# Altium footprint library MEGAphone.PcbLib: 64 footprints (part 4 of 4)
Each footprint in its own frame and in the unit in brackets; x right, y up, seen from the top. Pads: shape width x height; smd on the part's side, far side on the other; paste and mask are expansions set on the pad; w line width, h text height; cw(c..) or ccw(c..) is an arc to the next point about the centre after c.
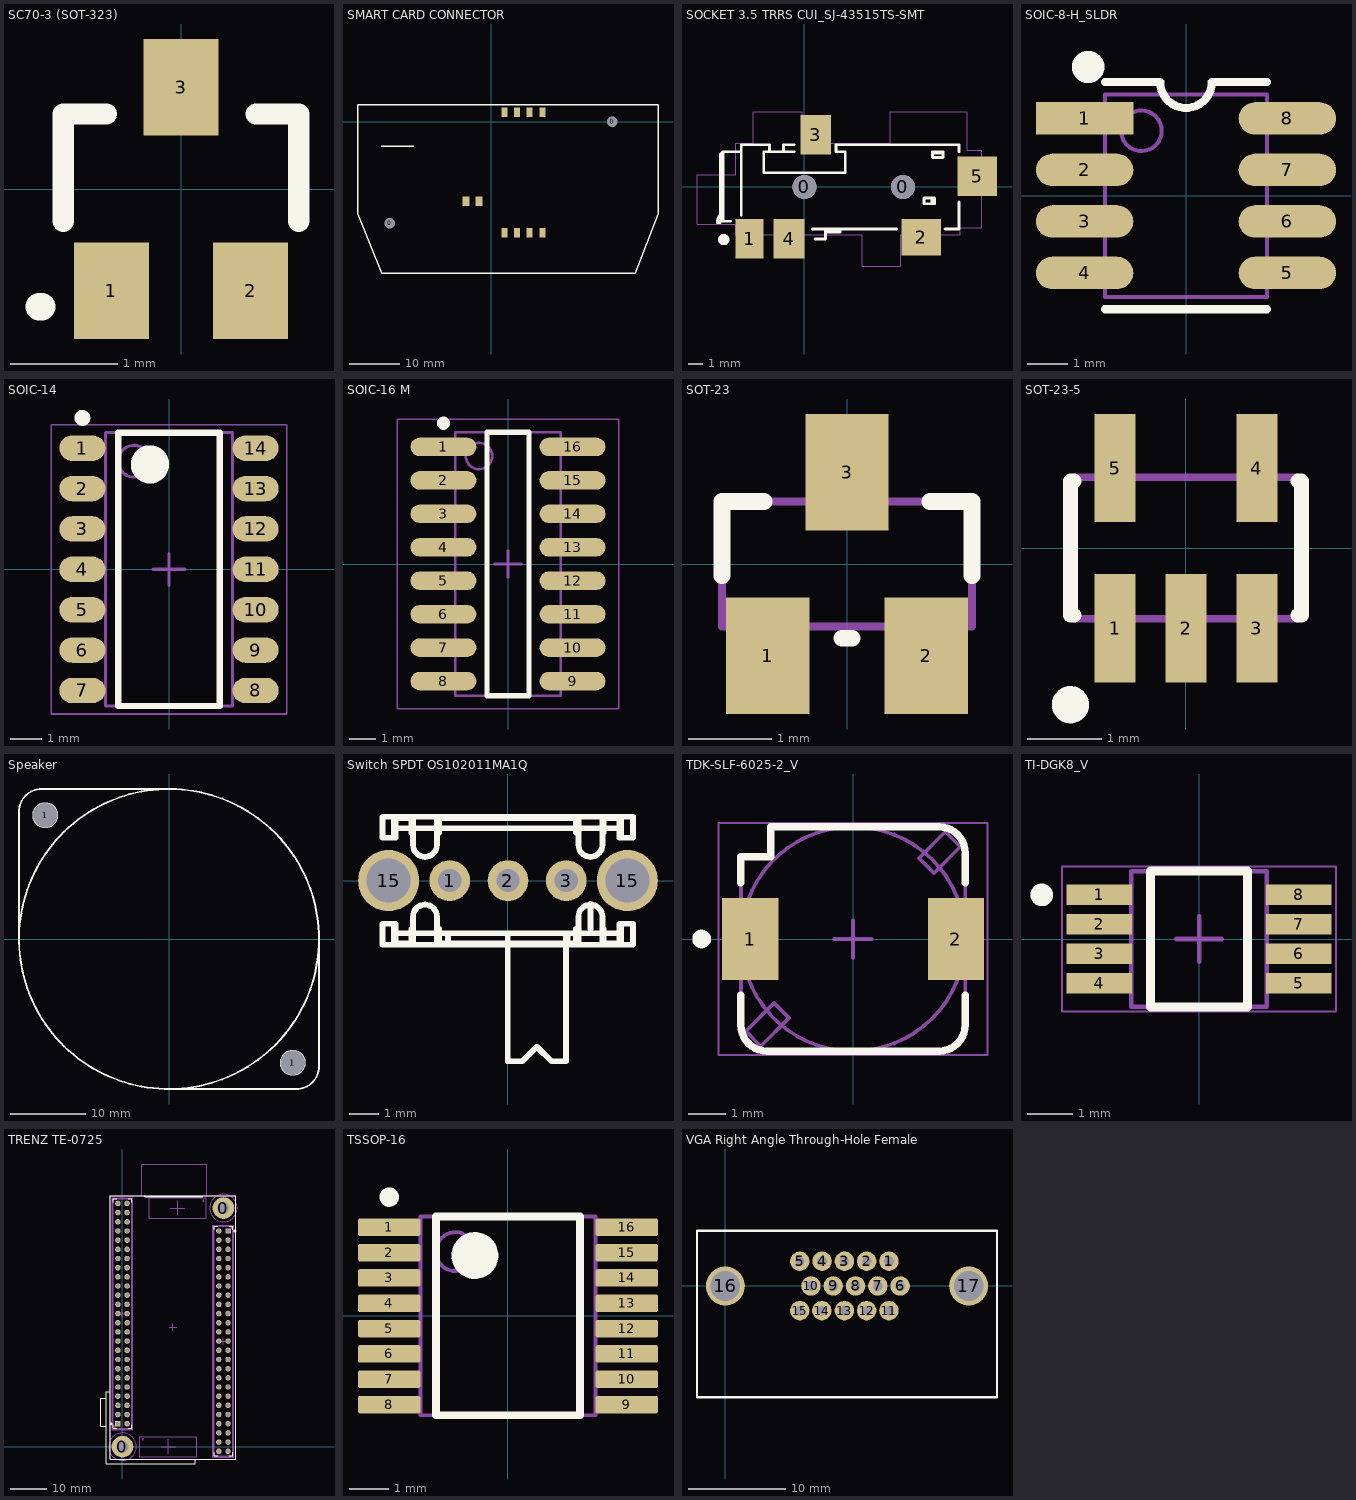
[diagram p3: the footprints below, top view; thin cyan lines are the x and y axes]

## SC70-3 (SOT-323) [mm]
height 0.9
pads (3):
  rect 0.7x0.9 smd paste-0.025 mask+0.05: 1(-0.65,-0.95) 2(0.65,-0.95) 3(0,0.95)
Top Overlay:
  lines w0.2: -1.1,-0.3 -1.1,0.7 -0.7,0.7 ; 0.7,0.7 1.1,0.7 1.1,-0.3
  lines w0.254: -1.325,-1.1 -1.3,-1.1
3D body: height 0.9, standoff 0, extent -1.075,-0.725 1.075,0.7

## SMART CARD CONNECTOR [mm] "609-4481-ND"
pads (12):
  round 1.524 hole 2.1: 0(-20.28,-20.32) 0(24.17,0)
  rect 1.2x1.9 smd: 1(10.2,-22.21) 2(7.66,-22.21) 3(5.12,-22.21) 4(2.58,-22.21) 5(10.2,1.89) 6(7.66,1.89) 7(5.12,1.89) 8(2.58,1.89)
  rect 1.4x1.9 smd: 9(-2.5,-15.91) 10(-5.04,-15.91)
Top Overlay:
  lines w0.254: -21.971,-4.953 -15.494,-4.953 ; -26.63,-18.411 -21.844,-30.3 28.702,-30.3 33.274,-18.411 33.274,3.4 -26.63,3.4 -26.63,-18.411
3D body "7312P0225A13LFC.stp": height 3.5, standoff -0.85, extent -25.51,-29.76 32.29,3.94

## SOCKET 3.5 TRRS CUI_SJ-43515TS-SMT [mm] "3.5 MM AUDIO JACKS"
height 5
pads (7):
  round 1.7 hole 1.7 unplated: 0(0,0) 0(7,0)
  rect 2x2.8 smd: 1(-3.9,-3.7)
  rect 2.8x2.6 smd: 2(8.3,-3.6)
  rect 2.2x2.8 smd: 3(0.8,3.7) 4(-1.1,-3.7)
  rect 2.8x2.8 smd: 5(12.3,0.75)
Top Overlay:
  circle w0.4: c-5.75,-3.75 r0.2
  lines w0.2: -6,-1.967 ccw(c-5.25,-2.55) -6.2,-2.55 -6,-2.55 cw(c-5.25,-2.55) -5.955,-2.294 ; -5.25,-2.449 -5.8,-2.449 ; -4.5,-2 -4.5,3 -2.5,3 -2.5,2.5 ; -4.5,2.5 -5.8,2.5 ; -2.9,2.4 -2.9,1 2.9,1 2.9,2.4 ; -2.9,2.5 -0.75,2.5 ; -1.5,2.5 -1.5,3 -0.75,3 ; 0.575,-3 1.5,-3 ; 0.75,-3.7 1.5,-3.7 1.5,-3 ; 1.5,-3.2 2.55,-3.2 2.55,-3 ; 2.338,-3.2 2.338,-3 ; 2.9,2.5 2.25,2.5 2.25,3 11,3 11,2.5 ; 6.55,-3 1.5,-3 ; 9.05,-0.8 9.05,-1.15 9.25,-1.15 ; 9.1,2.4 9.85,2.4 ; 10,-3 11,-3 11,-1.075 ; -5.8,-2.449 -5.8,2.5 ; -5.8,-2.449 -5.807,-2.442 -5.814,-2.435 -5.821,-2.428 -5.828,-2.42 -5.835,-2.413 -5.843,-2.406 -5.85,-2.398 -5.857,-2.39 -5.865,-2.383 -5.873,-2.375 -5.88,-2.367 -5.888,-2.359 -5.896,-2.351 -5.904,-2.343 -5.912,-2.335 -5.92,-2.327 -5.928,-2.318 -5.936,-2.31 -5.944,-2.302 -5.953,-2.293 -5.961,-2.285 -5.97,-2.276 -5.978,-2.267 -5.987,-2.258 -5.996,-2.249 -6,-2.245 -6,2.3 -5.8,2.5 ; 8.5,-1.2 9.25,-1.2 9.25,-0.8 8.5,-0.8 8.5,-1.2 ; 9.1,2.1 9.1,2.5 9.85,2.5 9.85,2.1 9.1,2.1
Mechanical 4:
  lines w0.05: -7.65,-2.65 -7.65,0.85 -4.9,0.85 -4.9,3.1 -3.65,3.1 -3.65,5.35 -0.15,5.35 -0.15,3.1 6.1,3.1 6.1,5.35 11.6,5.35 11.6,2.6 12.6,2.6 12.6,-2.9 11.1,-2.9 11.1,-3.4 6.85,-3.4 6.85,-5.65 4.1,-5.65 4.1,-3.4 -4.9,-3.4 -4.9,-2.65 -7.65,-2.65
3D body "CUI_SJ-43515TS-SMT-TR.step": height 5.1, standoff -0.7, extent -6.2,-4.5 13,4.5

## SOIC-8-H_SLDR [mm]
pads (8):
  rect 2.4x0.8 smd: 1(-2.5,1.905)
  oval 2.4x0.8 smd: 2(-2.5,0.635) 3(-2.5,-0.635) 4(-2.5,-1.905) 5(2.5,-1.905) 6(2.5,-0.635) 7(2.5,0.635) 8(2.5,1.905)
Top Overlay:
  circle w0.4: c-2.413,3.175 r0.2
  lines w0.2: -2,-2.8 2,-2.8 ; -2,2.8 -0.635,2.8 ccw(c0,2.8) 0.635,2.8 2,2.8
Mechanical 13:
  circle w0.1: c-1.1,1.6 r0.5
  lines w0.1: -2,-2.5 -2,2.5 2,2.5 2,-2.5 -2,-2.5
3D body: height 1.75, standoff 0.1, extent -2,-2.5 2,2.5

## SOIC-14 [mm] "SOIC, 14-Leads, Body 8.65x3.90mm, Pitch 1.27mm, IPC Medium Density"
height 1.75
pads (14):
  oval 1.45x0.8 smd: 1(-2.725,3.81) 2(-2.725,2.54) 3(-2.725,1.27) 4(-2.725,0) 5(-2.725,-1.27) 6(-2.725,-2.54) 7(-2.725,-3.81) 8(2.725,-3.81) 9(2.725,-2.54) 10(2.725,-1.27) 11(2.725,0) 12(2.725,1.27) 13(2.725,2.54) 14(2.725,3.81)
Top Overlay:
  circle w0.25: c-2.725,4.76 r0.125
  circle w0.6: c-0.6,3.3 r0.3
  lines w0.2: -1.6,-4.3 -1.6,4.3 1.6,4.3 1.6,-4.3 -1.6,-4.3
Mechanical 13:
  circle w0.1: c-1.1,3.4 r0.5
  lines w0.1: -2,-4.3 -2,4.3 2,4.3 2,-4.3 -2,-4.3
Mechanical 15:
  lines w0.05: -3.7,-4.55 -3.7,4.55 3.7,4.55 3.7,-4.55 -3.7,-4.55
  lines w0.1: -0.5,0 0.5,0 ; 0,-0.5 0,0.5
3D body "SOIC127P600X175-14N.step": height 1.75, standoff 0, extent -3,-4.3 3,4.3

## SOIC-16 M [mm] "SOIC 16 pin low density"
pads (16):
  oval 2.5x0.7 smd: 1(-2.45,4.445) 2(-2.45,3.175) 3(-2.45,1.905) 4(-2.45,0.635) 5(-2.45,-0.635) 6(-2.45,-1.905) 7(-2.45,-3.175) 8(-2.45,-4.445) 9(2.45,-4.445) 10(2.45,-3.175) 11(2.45,-1.905) 12(2.45,-0.635) 13(2.45,0.635) 14(2.45,1.905) 15(2.45,3.175) 16(2.45,4.445)
Top Overlay:
  circle w0.25: c-2.45,5.345 r0.125
  lines w0.2: -0.8,-5 0.8,-5 0.8,5 -0.8,5 -0.8,-5
Mechanical 13:
  circle w0.1: c-1.1,4.1 r0.5
  lines w0.1: -2,-5 2,-5 2,5 -2,5 -2,-5
Mechanical 15:
  lines w0.05: -4.2,-5.5 4.2,-5.5 4.2,5.5 -4.2,5.5 -4.2,-5.5
  lines w0.1: -0.5,0 0.5,0 ; 0,-0.5 0,0.5
3D body: height 1.75, standoff 0.1, extent -2,-5 2,5

## SOT-23 [mm]
height 8.9
pads (3):
  rect 1x1.4 smd: 1(-0.95,-1.1) 2(0.95,-1.1) 3(0,1.1)
Top Overlay:
  lines w0.2: -1.499,-0.14 -1.499,0.749 -0.991,0.749 ; -0.063,-0.889 0.064,-0.889 ; 0.991,0.749 1.499,0.749 1.499,-0.14
Mechanical 13:
  lines w0.1: -1.5,-0.75 -1.5,0.75 1.5,0.75 1.5,-0.75 -1.5,-0.75
3D body: height 1.3, standoff 0.1, extent -1.499,-0.749 1.499,0.749

## SOT-23-5 [mm]
pads (5):
  rect 0.55x1.45 smd: 1(-0.948,-1.075) 2(0.002,-1.075) 3(0.952,-1.075) 4(0.952,1.075) 5(-0.948,1.075)
Top Overlay:
  circle w0.25: c-1.548,-2.1 r0.125
  lines w0.2: -1.498,-0.9 -1.548,-0.9 -1.548,0.9 -1.498,0.9 ; 1.502,-0.9 1.552,-0.9 1.552,0.9 1.502,0.9
Mechanical 13:
  lines w0.1: -1.5,-0.95 1.5,-0.95 1.5,0.95 -1.5,0.95 -1.5,-0.95
3D body: height 1.45, standoff 0.08, extent -1.499,-0.949 1.499,0.949

## Speaker [mm]
pads (2):
  round 1.524 hole 3.2: 1(-16.5,16.5) 1(16.5,-16.5)
Top Overlay:
  circle w0.254: c0,0 r20
  circle w0.254: c16.5,-16.5 r1.6
  circle w0.254: c-16.5,16.5 r1.6
  lines w0.254: -20,0 -20,17 cw(c-17,17) -17,20 0,20 ; 0,-20 17,-20 ccw(c17,-17) 20,-17 20,0

## Switch SPDT OS102011MA1Q [mm] "C&K OS Series  Miniature Slide Switches RA, SPDT"
height 3.9
pads (5):
  round 1.4 hole 0.8 mask+0: 1(-2,0) 2(0,0) 3(2,0)
  round 2.1 hole 1.5 mask+0: 15(-4.1,0) 15(4.1,0)
Top Overlay:
  lines w0.2: -3.91,-1.482 -3.91,-2.206 -4.31,-2.206 -4.31,-1.482 -3.853,-1.482 -3.853,-2.206 3.833,-2.206 3.833,-1.482 4.29,-1.482 4.29,-2.206 3.89,-2.206 3.89,-1.482 ; -3.91,1.47 -3.91,2.194 -4.31,2.194 -4.31,1.47 -3.853,1.47 -3.853,2.194 3.833,2.194 3.833,1.47 4.29,1.47 4.29,2.194 3.89,2.194 3.89,1.47 ; -3.853,-1.806 3.833,-1.806 ; -3.853,1.794 3.833,1.794 ; -3.85,-2.156 -3.31,-2.156 -3.31,-1.656 ; -3.85,2.144 -3.31,2.144 -3.31,1.644 ; -3.26,-2.206 -3.26,-1.236 cw(c-2.85,-1.236) -2.44,-1.236 -2.44,-2.206 ; -3.26,2.194 -3.26,1.224 ccw(c-2.85,1.224) -2.44,1.224 -2.44,2.194 ; -2.36,-1.656 -2.36,-2.156 2.34,-2.156 2.34,-1.656 ; -2.36,1.644 -2.36,2.144 2.34,2.144 2.34,1.644 ; -2.06,-2.206 -2.06,-1.806 ; -0.01,-1.806 -0.01,-2.206 -0.01,-6.206 0.49,-6.206 0.99,-5.706 1.49,-6.206 1.99,-6.206 1.99,-2.206 1.99,-1.806 ; 2.04,-2.206 2.04,-1.806 ; 2.42,-2.206 2.42,-1.236 cw(c2.83,-1.236) 3.24,-1.236 3.24,-2.206 ; 2.42,2.194 2.42,1.224 ccw(c2.83,1.224) 3.24,1.224 3.24,2.194 ; 2.83,-1.667 2.83,-0.806 ; 3.29,-1.656 3.29,-2.156 3.83,-2.156 ; 3.29,1.644 3.29,2.144 3.83,2.144
3D body "OS102011MA1QN1.stp": height 4.7, standoff -2.9, extent -4.3,-6.2 4.3,2.2

## TDK-SLF-6025-2_V [mm] "SMD, 2-Leads, Body 6x6mm, Height 2.7mm"
height 2.7
pads (2):
  rect 1.5x2.2 smd: 1(-2.75,0) 2(2.75,0)
Top Overlay:
  circle w0.25: c-4.05,0 r0.125
  lines w0.2: -3,-1.5 -3,-2.3 ccw(c-2.3,-2.3) -2.3,-3 2.3,-3 ccw(c2.3,-2.3) 3,-2.3 3,-1.5 ; -3,1.5 -3,2.2 -2.2,2.2 -2.2,3 2.3,3 cw(c2.3,2.3) 3,2.3 3,1.5
Mechanical 13:
  circle w0.1: c0,0 r3
  lines w0.1: -3,-2.3 ccw(c-2.3,-2.3) -2.3,-3 2.3,-3 ccw(c2.3,-2.3) 3,-2.3 3,-1 2.1,-1 2.1,1 3,1 3,2.3 ccw(c2.3,2.3) 2.3,3 -2.2,3 -2.2,2.2 -3,2.2 -3,1 -2.1,1 -2.1,-1 -3,-1 -3,-2.3 ; -2.867,-2.467 -2.467,-2.867 -1.712,-2.112 -2.112,-1.712 -2.867,-2.467 ; 1.762,2.161 2.467,2.867 2.867,2.467 2.161,1.762 1.762,2.161
Mechanical 15:
  lines w0.05: -3.6,-3.1 3.6,-3.1 3.6,3.1 -3.6,3.1 -3.6,-3.1
  lines w0.1: -0.5,0 0.5,0 ; 0,-0.5 0,0.5
3D body: height 1.3, standoff 0.8, extent 1.762,1.762 2.867,2.867
3D body: height 1.3, standoff 0.8, extent -2.829,-2.829 -1.712,-1.712
3D body: height 0.8, standoff 0, extent -3.001,-3.001 3.001,3.001
3D body: height 2.7, standoff 0.8, extent -2.999,-2.999 2.999,2.999

## TEST [mm]

## TI-DGK8_V [mm] "VSSOP, 8-Leads, Body 3x3mm, Pitch 0.65mm"
height 1.1
pads (8):
  rect 1.45x0.45 smd paste+0 mask+0.05: 1(-2.2,0.975) 2(-2.2,0.325) 3(-2.2,-0.325) 4(-2.2,-0.975) 5(2.2,-0.975) 6(2.2,-0.325) 7(2.2,0.325) 8(2.2,0.975)
Top Overlay:
  circle w0.25: c-3.475,0.975 r0.125
  lines w0.2: -1.075,-1.5 1.075,-1.5 1.075,1.5 -1.075,1.5 -1.075,-1.5
Mechanical 13:
  lines w0.1: -1.5,-1.5 1.5,-1.5 1.5,1.5 -1.5,1.5 -1.5,-1.5
Mechanical 15:
  lines w0.05: -3.025,-1.6 3.025,-1.6 3.025,1.6 -3.025,1.6 -3.025,-1.6
  lines w0.1: -0.5,0 0.5,0 ; 0,-0.5 0,0.5
3D body: height 1.1, standoff 0.05, extent -1.5,-1.5 1.5,1.5

## TRENZ TE-0725 [mm] "FPGA Break out using 2 off 50pos headers"
pads (102):
  round 6 hole 3.2: 0(0,0) 0(27.94,66.042)
  rect 1.5x1.5 hole 1: 1A(-1.27,6.351) 1B(29.21,59.692)
  round 1.5 hole 1: 2A(1.27,6.351) 2B(26.67,59.692) 3A(-1.27,8.891) 3B(29.21,57.152) 4A(1.27,8.891) 4B(26.67,57.152) 5A(-1.27,11.431) 5B(29.21,54.612) 6A(1.27,11.431) 6B(26.67,54.612) 7A(-1.27,13.971) 7B(29.21,52.072) 8A(1.27,13.971) 8B(26.67,52.072) 9A(-1.27,16.511) 9B(29.21,49.532) 10A(1.27,16.511) 10B(26.67,49.532) 11A(-1.27,19.051) 11B(29.21,46.992) 12A(1.27,19.051) 12B(26.67,46.992) 13A(-1.27,21.591) 13B(29.21,44.452) 14A(1.27,21.591) 14B(26.67,44.452) 15A(-1.27,24.131) 15B(29.21,41.912) 16A(1.27,24.131) 16B(26.67,41.912) 17A(-1.27,26.671) 17B(29.21,39.372) 18A(1.27,26.671) 18B(26.67,39.372) 19A(-1.27,29.211) 19B(29.21,36.832) 20A(1.27,29.211) 20B(26.67,36.832) 21A(-1.27,31.751) 21B(29.21,34.292) 22A(1.27,31.751) 22B(26.67,34.292) 23A(-1.27,34.291) 23B(29.21,31.752) 24A(1.27,34.291) 24B(26.67,31.752) 25A(-1.27,36.831) 25B(29.21,29.212) 26A(1.27,36.831) 26B(26.67,29.212) 27A(-1.27,39.371) 27B(29.21,26.672) 28A(1.27,39.371) 28B(26.67,26.672) 29A(-1.27,41.911) 29B(29.21,24.132) 30A(1.27,41.911) 30B(26.67,24.132) 31A(-1.27,44.451) 31B(29.21,21.592) 32A(1.27,44.451) 32B(26.67,21.592) 33A(-1.27,46.991) 33B(29.21,19.052) 34A(1.27,46.991) 34B(26.67,19.052) 35A(-1.27,49.531) 35B(29.21,16.512) 36A(1.27,49.531) 36B(26.67,16.512) 37A(-1.27,52.071) 37B(29.21,13.972) 38A(1.27,52.071) 38B(26.67,13.972) 39A(-1.27,54.611) 39B(29.21,11.432) 40A(1.27,54.611) 40B(26.67,11.432) 41A(-1.27,57.151) 41B(29.21,8.892) 42A(1.27,57.151) 42B(26.67,8.892) 43A(-1.27,59.691) 43B(29.21,6.352) 44A(1.27,59.691) 44B(26.67,6.352) 45A(-1.27,62.231) 45B(29.21,3.812) 46A(1.27,62.231) 46B(26.67,3.812) 47A(-1.27,64.771) 47B(29.21,1.272) 48A(1.27,64.771) 48B(26.67,1.272) 49A(-1.27,67.311) 49B(29.21,-1.268) 50A(1.27,67.311) 50B(26.67,-1.268)
Top Overlay:
  circle w0.4: c-3.17,6.351 r0.2
  circle w0.4: c31.11,59.692 r0.2
  lines w0.2: -4.476,5.711 -5.998,5.711 -5.998,13.393 -4.476,13.393 ; -3.431,15.227 -4.476,15.227 -4.476,-4.793 20.078,-4.793 20.078,-3.457 ; -2.54,6.061 -2.54,5.081 -1.56,5.081 ; -2.54,67.601 -2.54,68.581 -1.56,68.581 ; 1.56,5.081 2.54,5.081 2.54,6.061 ; 1.56,68.581 2.54,68.581 2.54,67.601 ; 6.2,69.2 6.2,69.463 ; 6.26,69.21 22.143,69.21 22.143,69.473 ; 25.4,-1.558 25.4,-2.538 26.38,-2.538 ; 25.4,59.982 25.4,60.962 26.38,60.962 ; 29.5,-2.538 30.48,-2.538 30.48,-1.558 ; 29.5,60.962 30.48,60.962 30.48,59.982 ; -3.431,-3.457 -3.431,69.473 31.369,69.473 31.369,-3.457 -3.431,-3.457
Mechanical 11:
  circle w0.3: c22.32,68.089 r0.15
  circle w0.3: c5.62,2.046 r0.15
  circle w0.3: c-2.17,5.496 r0.15
  circle w0.3: c30.11,60.547 r0.15
  lines w0.05: -1,36.831 1,36.831 ; 0,-1 0,1 ; 0,35.831 0,37.831 ; 5.145,69.486 5.145,78.224 23.245,78.224 23.245,69.486 ; 10.7,0 14.7,0 ; 12.7,-2 12.7,2 ; 12.97,33.021 14.97,33.021 ; 13.24,66.042 17.24,66.042 ; 13.97,32.021 13.97,34.021 ; 15.24,64.042 15.24,68.042 ; 26.94,66.042 28.94,66.042 ; 26.94,29.212 28.94,29.212 ; 27.94,28.212 27.94,30.212 ; 27.94,65.042 27.94,67.042 ; -3.43,-3.444 31.37,-3.444 31.37,69.486 -3.43,69.486 -3.43,-3.444 ; -2.8,4.831 -2.8,68.831 2.8,68.831 2.8,4.831 -2.8,4.831 ; -1,0 1,0 -1,0 ; 4.82,-2.8 20.58,-2.8 20.58,2.8 4.82,2.8 4.82,-2.8 ; 7.36,63.242 7.36,68.842 23.12,68.842 23.12,63.242 7.36,63.242 ; 25.14,-2.788 25.14,61.212 30.74,61.212 30.74,-2.788 25.14,-2.788
  text "For TE0725LP (Top side)" at 7.52,62.246 h0.7
  text "Baseboard pin 1 (Top side)" at -1.755,6.221 h0.7
  text "J1" at 27.245,33.021 h1
  text "J2" at -0.905,33.021 h1
  text "Baseboard pin 1 (Top side)" at 29.72,59.821 h0.7
  text "Module pin 1 (Top side)" at 5.32,3.121 h0.7
  text "Module pin 1 (Bottom side)" at -0.655,6.221 h0.7
  text "Module pin 1 (Bottom side)" at 28.595,59.822 h0.7
Mechanical 13:
  circle w0.1: c0,0 r1.6
  circle w0.1: c0,0 r3.8
  circle w0.1: c27.94,66.042 r1.6
  circle w0.1: c27.94,66.042 r3.8
  lines w0.1: -2.54,5.081 2.54,5.081 2.54,68.581 -2.54,68.581 -2.54,5.081 ; 25.4,-2.538 25.4,60.962 30.48,60.962 30.48,-2.538 25.4,-2.538
  text "2" at 2,5.971 h1
  text "1" at -1,5.971 h1
  text ".Designator" at 0.5,36.331 h1
  text "50" at 2,66.191 h1
  text "49" at -1,66.191 h1
  text "2" at 25.94,60.072 h1
  text "1" at 28.94,60.072 h1
  text ".Designator" at 27.44,29.712 h1
  text "50" at 25.94,-0.148 h1
  text "49" at 28.94,-0.148 h1
Mechanical 14:
  circle w0.1: c0,0 r1.6
  circle w0.1: c0,0 r3.8
  circle w0.1: c27.94,66.042 r1.6
  circle w0.1: c27.94,66.042 r3.8
Mechanical 15:
  circle w0.05: c0,0 r3.8
  circle w0.05: c27.94,66.042 r3.8
  lines w0.05: -1,0 1,0 ; -1,36.831 1,36.831 ; 0,-1 0,1 ; 0,35.831 0,37.831 ; 26.94,66.042 28.94,66.042 ; 26.94,29.212 28.94,29.212 ; 27.94,28.212 27.94,30.212 ; 27.94,65.042 27.94,67.042 ; -2.9,4.731 2.9,4.731 2.9,68.931 -2.9,68.931 -2.9,4.731 ; 25.04,-2.888 25.04,61.312 30.84,61.312 30.84,-2.888 25.04,-2.888
Mechanical 16:
  circle w0.05: c0,0 r3.8
  circle w0.05: c27.94,66.042 r3.8
  lines w0.05: -1,0 1,0 ; 0,-1 0,1 ; 26.94,66.042 28.94,66.042 ; 27.94,65.042 27.94,67.042
3D body "TE0725-03.step": height 27.23, standoff 2.86, extent -5.998,-4.793 31.688,77.971
3D body "pcb_connector_803-87-050-10-132101.stp": height 7, standoff -2.99, extent -2.54,5.081 2.54,68.581
3D body "pcb_connector_803-87-050-10-132101.stp": height 7, standoff -2.99, extent 25.4,-2.538 30.48,60.962

## TSSOP-16 [mm] "SOP, 16-Leads, Body 5.1x4.5mm, Pitch 0.65mm, IPC Low Density"
height 1.2
pads (16):
  rrect22% 1.6x0.45 smd: 1(-3.05,2.275) 2(-3.05,1.625) 3(-3.05,0.975) 4(-3.05,0.325) 5(-3.05,-0.325) 6(-3.05,-0.975) 7(-3.05,-1.625) 8(-3.05,-2.275) 9(3.05,-2.275) 10(3.05,-1.625) 11(3.05,-0.975) 12(3.05,-0.325) 13(3.05,0.325) 14(3.05,0.975) 15(3.05,1.625) 16(3.05,2.275)
Top Overlay:
  circle w0.6: c-0.85,1.55 r0.3
  circle w0.25: c-3.05,3.05 r0.125
  lines w0.2: -1.85,-2.55 1.85,-2.55 1.85,2.55 -1.85,2.55 -1.85,-2.55
Mechanical 13:
  circle w0.1: c-1.35,1.65 r0.5
  lines w0.1: -2.25,-2.55 2.25,-2.55 2.25,2.55 -2.25,2.55 -2.25,-2.55
3D body "PW0016AakaMTC16.stp": height 1, standoff 0, extent -3.21,-2.5 3.21,2.5

## VGA Right Angle Through-Hole Female [mm] "Assman WSW AHDF15A-KG-TAXB"
height 12.548
pads (17):
  round 2 hole 1: 1(16.805,2.54) 2(14.515,2.54) 3(12.225,2.54) 4(9.935,2.54) 5(7.645,2.54) 6(17.95,0) 7(15.66,0) 8(13.37,0) 9(11.08,0) 10(8.79,0) 11(16.805,-2.54) 12(14.515,-2.54) 13(12.225,-2.54) 14(9.906,-2.54) 15(7.645,-2.54)
  round 4 hole 3.05: 16(0,0) 17(24.99,0)
Top Overlay:
  lines w0.254: -2.91,-11.43 -2.91,5.67 27.9,5.67 27.9,-11.43 -2.91,-11.43
3D body "HDL_15-SL-B.STEP": height 13.28, standoff -3.19, extent -2.827,-17.272 27.973,4.928